# Altium footprint library RPSLib.PcbLib: 116 footprints (part 2 of 8)
Each footprint in its own frame and in the unit in brackets; x right, y up, seen from the top. Pads: shape width x height; smd on the part's side, far side on the other; paste and mask are expansions set on the pad; w line width, h text height; cw(c..) or ccw(c..) is an arc to the next point about the centre after c.
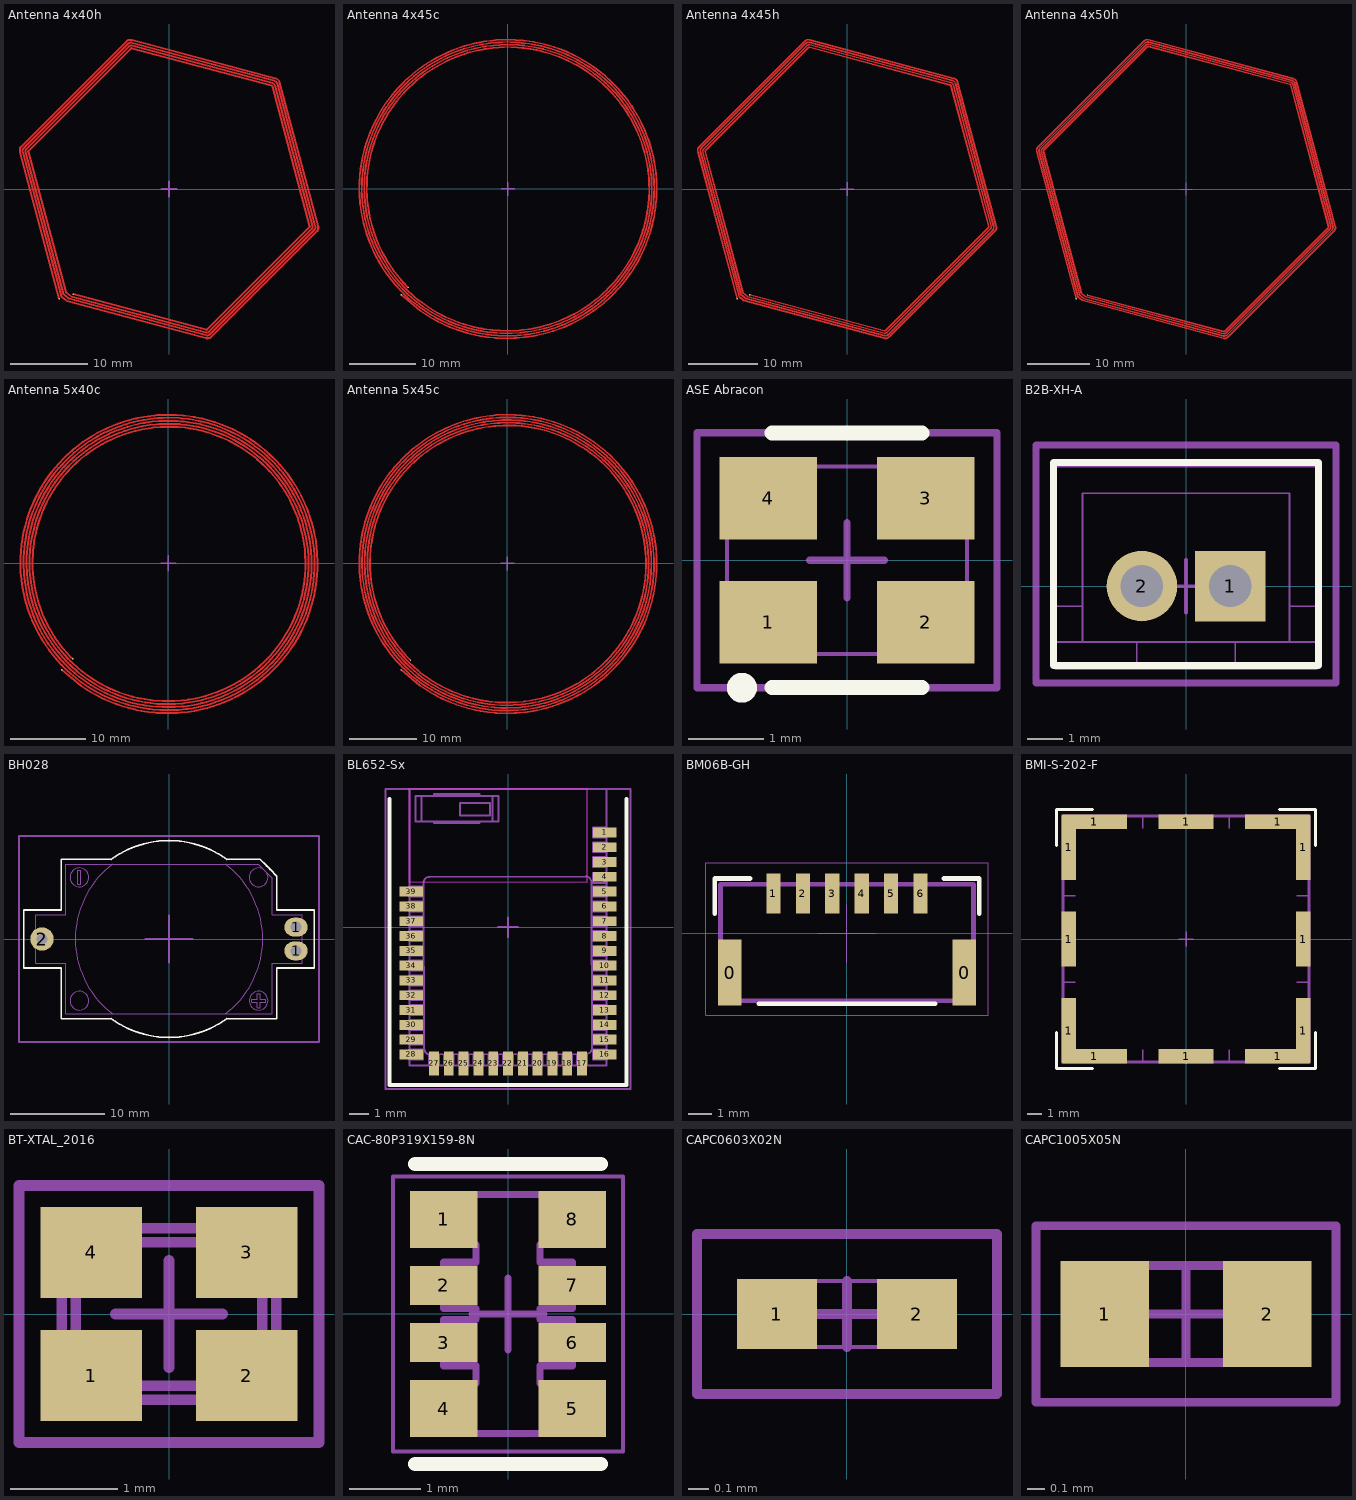
[diagram p1: the footprints below, top view; thin cyan lines are the x and y axes]

## Antenna 4x40h [mm] "Антенна гексагональная 4 витка, 40 мм"
pads (2):
  rect 0.2x0.2 smd mask+0.07: 1(-14.142,-14.142) 2(-12.328,-13.552)
Top Layer:
  region: 325 vertices and 0 holes, not listed, extent -19.326,-19.326 19.326,19.326
Mechanical 15:
  lines w0.2: -1,0 1,0 ; 0,-1 0,1

## Antenna 4x45c [mm] "Антенна спиральная 4 витка, 45 мм"
pads (2):
  rect 0.2x0.2 smd mask+0.07: 1(-15.994,-15.825) 2(-14.933,-14.765)
Top Layer:
  drawing of 1 lines, arcs and shapes, not listed
Mechanical 15:
  lines w0.2: -1,0 1,0 ; 0,-1 0,1

## Antenna 4x45h [mm] "Антенна гексагональная 4 витка, 45 мм"
pads (2):
  rect 0.2x0.2 smd mask+0.07: 1(-15.91,-15.91) 2(-14.095,-15.32)
Top Layer:
  region: 327 vertices and 0 holes, not listed, extent -21.741,-21.741 21.741,21.741
Mechanical 15:
  lines w0.2: -1,0 1,0 ; 0,-1 0,1

## Antenna 4x50h [mm] "Антенна гексагональная 4 витка, 50 мм"
pads (2):
  rect 0.2x0.2 smd mask+0.07: 1(-17.678,-17.678) 2(-15.863,-17.088)
Top Layer:
  region: 319 vertices and 0 holes, not listed, extent -24.156,-24.156 24.156,24.156
Mechanical 15:
  lines w0.2: -1,0 1,0 ; 0,-1 0,1

## Antenna 5x40c [mm] "Антенна спиральная 5 витков, 40 мм"
pads (2):
  rect 0.2x0.2 smd mask+0.07: 1(-14.142,-14.142) 2(-12.728,-12.728)
Top Layer:
  drawing of 1 lines, arcs and shapes, not listed
Mechanical 15:
  lines w0.2: -1,0 1,0 ; 0,-1 0,1

## Antenna 5x45c [mm] "Антенна спиральная 5 витков, 45 мм"
pads (2):
  rect 0.2x0.2 smd mask+0.07: 1(-15.91,-15.91) 2(-14.496,-14.496)
Top Layer:
  drawing of 1 lines, arcs and shapes, not listed
Mechanical 15:
  lines w0.2: -1,0 1,0 ; 0,-1 0,1

## ASE Abracon [mm]
height 1.2
pads (4):
  rect 1.3x1.1 smd mask+0.07: 1(-1.05,-0.825) 2(1.05,-0.825) 3(1.05,0.825) 4(-1.05,0.825)
Top Overlay:
  circle w0.2: c-1.4,-1.7 r0.1
  lines w0.2: -1,-1.7 1,-1.7 ; -1,1.7 1,1.7
Mechanical 13:
  lines w0.05: -1.6,-1.25 1.6,-1.25 1.6,1.25 -1.6,1.25 -1.6,-1.25
Mechanical 15:
  lines w0.1: -0.5,0 0.5,0 ; 0,-0.5 0,0.5 ; -2,-1.7 -2,1.7 2,1.7 2,-1.7 -2,-1.7
3D body "ASE.stp": height 1.2, standoff 0, extent -1.6,-1.25 1.6,1.25

## B2B-XH-A [mm] "2 pin connector"
height 7
pads (2):
  rect 2x2 hole 1.2 mask+0.07: 1(1.25,0)
  round 2 hole 1.2 mask+0.07: 2(-1.25,0)
Top Overlay:
  lines w0.2: -3.75,-2.25 3.75,-2.25 3.75,3.5 -3.75,3.5 -3.75,-2.25
Mechanical 13:
  lines w0.05: -1.753,-2.349 1.753,-2.349 ; -1.753,-1.587 1.753,-1.587 ; -3.696,-1.587 -1.894,-1.587 -1.397,-1.587 -1.397,-2.349 -1.894,-2.349 -3.696,-2.349 -3.696,-1.587 ; -3.696,-1.587 -3.696,-0.572 ; -3.696,-1.587 -2.934,-1.587 -2.934,-0.572 ; -3.696,-0.572 -3.696,3.391 3.696,3.391 3.696,-0.572 ; -3.696,-0.572 -2.934,-0.572 ; -3.696,-0.572 -2.934,-0.572 ; -2.934,-0.572 -2.934,2.629 2.934,2.629 2.934,-0.572 ; 2.934,-0.572 3.696,-0.572 ; 2.934,-0.572 2.934,-1.587 3.696,-1.587 ; 2.934,-0.572 3.696,-0.572 ; 3.696,-1.587 1.894,-1.587 1.397,-1.587 1.397,-2.349 1.894,-2.349 3.696,-2.349 3.696,-1.587 ; 3.696,-1.587 3.696,-0.572
Mechanical 15:
  lines w0.1: -0.75,0 0.75,0 ; 0,-0.75 0,0.75
  lines w0.2: -4.25,-2.75 -4.25,4 4.25,4 4.25,-2.75 -4.25,-2.75
3D body "B2B-XH-A.stp": height 7.11, standoff -3.81, extent -3.696,-2.349 3.696,3.391

## BH028 [mm] "Держатель батареи"
height 5.5
pads (3):
  oval 2.5x2 hole 1.2 mask+0.07: 1(13.55,-1.27) 1(13.55,1.27)
  round 2.5 hole 1.2 mask+0.07: 2(-13.55,0)
Top Overlay:
  lines w0.2: -15.5,-3.1 -15.5,3.1 -11.5,3.1 -11.5,8.5 -6.164,8.5 cw(c0,0) 6.164,8.5 9.707,8.5 10.404,7.803 10.789,7.418 11.5,6.707 11.5,3.1 15.5,3.1 15.5,-3.1 11.5,-3.1 11.5,-8.5 6.164,-8.5 cw(c0,0) -6.164,-8.5 -11.5,-8.5 -11.5,-3.1 -15.5,-3.1
Mechanical 13:
  circle w0.1: c9.562,-6.577 r1
  circle w0.1: c-9.562,-6.577 r1
  circle w0.1: c-9.562,6.577 r1
  lines w0.1: -6,-8 cw(c0,0) -6,8 ; -6,-8 -11,-8 -11,-2.6 -14.2,-2.6 -14.2,2.6 -11,2.6 -11,8 -6,8 ; -6,-8 6,-8 ; -6,8 6,8 ; 6,-8 ccw(c0,0) 6,8 ; 6,-8 11,-8 11,-2.6 14.2,-2.6 14.2,2.6 11,2.6 11,6.5 10.435,7.065 ; 6,8 9.5,8 10.051,7.449 ; 10.051,7.449 ccw(c9.562,6.577) 10.435,7.065 ; 10.051,7.449 10.435,7.065 ; -9.712,5.827 -9.412,5.827 -9.412,7.327 -9.712,7.327 -9.712,5.827 ; 8.812,-6.727 9.412,-6.727 9.412,-7.327 9.712,-7.327 9.712,-6.727 10.312,-6.727 10.312,-6.427 9.712,-6.427 9.712,-5.827 9.412,-5.827 9.412,-6.427 8.812,-6.427 8.812,-6.727
Mechanical 15:
  lines w0.2: -2.5,0 2.5,0 ; 0,-2.5 0,2.5 ; -16,-11 -16,11 16,11 16,-11 -16,-11
3D body "BH028.stp": height 5.5, standoff -2, extent -14.2,-8 14.2,8

## BL652-Sx [mm]
height 2.1
pads (39):
  rect 1.2x0.5 smd mask+0.07: 1(4.9,4.8) 2(4.9,4.046) 3(4.9,3.3) 4(4.9,2.551) 5(4.9,1.801) 6(4.9,1.052) 7(4.9,0.298) 8(4.9,-0.449) 9(4.9,-1.2) 10(4.9,-1.95) 11(4.9,-2.699) 12(4.9,-3.45) 13(4.9,-4.2) 14(4.9,-4.95) 15(4.9,-5.697) 16(4.9,-6.451) 28(-4.9,-6.451) 29(-4.9,-5.697) 30(-4.9,-4.95) 31(-4.9,-4.2) 32(-4.9,-3.45) 33(-4.9,-2.699) 34(-4.9,-1.95) 35(-4.9,-1.2) 36(-4.9,-0.449) 37(-4.9,0.298) 38(-4.9,1.052) 39(-4.9,1.801)
  rect 0.5x1.2 smd mask+0.07: 17(3.75,-6.905) 18(3.002,-6.905) 19(2.252,-6.905) 20(1.502,-6.905) 21(0.751,-6.905) 22(-0.001,-6.905) 23(-0.749,-6.905) 24(-1.5,-6.905) 25(-2.25,-6.905) 26(-3,-6.905) 27(-3.748,-6.905)
Top Overlay:
  lines w0.2: -6,6.5 -6,-8 6,-8 6,6.5
Keep-Out Layer:
  lines w0.1: -5,2.275 4,2.275 4,7 -5,7 -5,2.275
Mechanical 13:
  drawing of 296 lines, arcs and shapes, not listed
Mechanical 15:
  lines w0.1: -0.5,0 0.5,0 ; 0,-0.5 0,0.5 ; -6.2,-8.2 6.2,-8.2 6.2,7 -6.2,7 -6.2,-8.2
3D body "BL652-SA.stp": height 2.35, standoff 0, extent -5.008,-7.006 5.008,7

## BM06B-GH [mm]
height 4.05
pads (8):
  rect 1x2.8 smd paste-0.05: 0(-4.975,-1.675) 0(4.975,-1.675)
  rect 0.6x1.7 smd paste-0.05: 1(-3.125,1.675) 2(-1.875,1.675) 3(-0.625,1.675) 4(0.625,1.675) 5(1.875,1.675) 6(3.125,1.675)
Top Overlay:
  lines w0.2: -5.625,0.825 -5.625,2.325 -4.125,2.325 ; -3.75,-3 3.75,-3 ; 4.125,2.325 5.625,2.325 5.625,0.825
Mechanical 13:
  lines w0.2: -5.375,-2.875 5.375,-2.875 5.375,2.075 -5.375,2.075 -5.375,-2.875
Mechanical 15:
  lines w0.05: -1.25,0 1.25,0 ; 0,-1.25 0,1.25 ; -6,-3.5 -6,3 6,3 6,-3.5 -6,-3.5
3D body "BM06B-GHS-TBT.STEP": height 4.18, standoff -0.03, extent -5.375,-2.875 5.375,2.075

## BMI-S-202-F [mm] "EMI Shield"
height 3.6
pads (12):
  rect 1x4.55 smd paste-0.07 mask+0.07: 1(-8.15,-6.375) 1(-8.15,6.375) 1(8.15,-6.375) 1(8.15,6.375)
  rect 1x3.8 smd paste-0.07 mask+0.07: 1(-8.15,0) 1(8.15,0)
  rect 4.55x1 smd paste-0.07 mask+0.07: 1(-6.375,-8.15) 1(-6.375,8.15) 1(6.375,-8.15) 1(6.375,8.15)
  rect 3.8x1 smd paste-0.07 mask+0.07: 1(0,-8.15) 1(0,8.15)
Top Overlay:
  lines w0.2: -9,-6.5 -9,-9 -6.5,-9 ; -9,6.5 -9,9 -6.5,9 ; 6.5,-9 9,-9 9,-6.5 ; 6.5,9 9,9 9,6.5
Mechanical 13:
  lines w0.1: -8.549,-3 -7.7,-3 ; -8.549,3 -7.7,3 ; -3,-8.549 -3,-7.7 ; -3,7.7 -3,8.55 ; 3,-8.549 3,-7.7 ; 3,7.7 3,8.55 ; 7.7,-3 8.55,-3 ; 7.7,3 8.55,3
  lines w0.2: -8.549,-8.549 -8.549,8.55 8.55,8.55 8.55,-8.549 -8.549,-8.549
Mechanical 15:
  lines w0.1: -0.5,0 0.5,0 ; 0,-0.5 0,0.5
3D body "Laird-BMI-S-202-F.stp": height 3.6, standoff 0, extent -8.549,-8.549 8.55,8.55

## BT-XTAL_2016 [mm] "Crystal 2.0 x 1.6 mm"
height 0.5
pads (4):
  rect 0.95x0.85 smd: 1(-0.725,-0.575) 2(0.725,-0.575) 3(0.725,0.575) 4(-0.725,0.575)
Mechanical 13:
  lines w0.1: -1,-0.7 cw(c-1,-0.8) -0.9,-0.8 0.9,-0.8 cw(c1,-0.8) 1,-0.7 1,0.7 cw(c1,0.8) 0.9,0.8 -0.9,0.8 cw(c-1,0.8) -1,0.7 -1,-0.7 ; -0.87,-0.57 ccw(c-0.77,-0.57) -0.77,-0.67 0.77,-0.67 ccw(c0.77,-0.57) 0.87,-0.57 0.87,0.57 ccw(c0.77,0.57) 0.77,0.67 -0.77,0.67 ccw(c-0.77,0.57) -0.87,0.57 -0.87,-0.57
Mechanical 15:
  lines w0.1: -0.5,0 0.5,0 ; 0,-0.5 0,0.5 ; -1.4,-1.2 1.4,-1.2 1.4,1.2 -1.4,1.2 -1.4,-1.2
3D body: height 0.56, standoff 0.15, extent -0.7,-0.65 0.7,0.65
3D body "User Library-GeyerElectronics_KX5.step": height 0.56, standoff 0, extent -1.05,-0.85 1.05,0.85

## CAC-80P319X159-8N [mm] "Chip Array, ConvexS, 8-Leads, Pitch 0.80mm,  Body 3.20x1.60mm,  IPC Medium Density"
height 1
pads (8):
  rect 0.95x0.8 smd mask+0.07: 1(-0.9,1.325) 4(-0.9,-1.325) 5(0.9,-1.325) 8(0.9,1.325)
  rect 0.95x0.55 smd mask+0.07: 2(-0.9,0.4) 3(-0.9,-0.4) 6(0.9,-0.4) 7(0.9,0.4)
Top Overlay:
  lines w0.2: -1.3,-2.1 1.3,-2.1 ; -1.3,2.1 1.3,2.1
Mechanical 13:
  lines w0.1: -0.9,-1.675 0.9,-1.675 0.9,-0.975 0.45,-0.975 0.45,-0.725 0.9,-0.725 0.9,-0.075 0.45,-0.075 0.45,0.075 0.9,0.075 0.9,0.725 0.45,0.725 0.45,0.975 0.9,0.975 0.9,1.675 -0.9,1.675 -0.9,0.975 -0.45,0.975 -0.45,0.725 -0.9,0.725 -0.9,0.075 -0.45,0.075 -0.45,-0.075 -0.9,-0.075 -0.9,-0.725 -0.45,-0.725 -0.45,-0.975 -0.9,-0.975 -0.9,-1.675
Mechanical 15:
  lines w0.05: -1.61,-1.925 1.61,-1.925 1.61,1.925 -1.61,1.925 -1.61,-1.925
  lines w0.1: -0.5,0 0.5,0 ; 0,-0.5 0,0.5
3D body "CAC-80P319X159-8N.step": height 1, standoff 0, extent -0.95,-1.675 0.95,1.675

## CAPC0603X02N [mm] "Chip Capacitor, 2-Leads, Body 0.60x0.30mm, IPC Medium Density"
height 0.23
pads (2):
  rect 0.4x0.35 smd paste-1: 1(-0.35,0) 2(0.35,0)
Top Paste:
  region: 0.45,0.15 0.46,0.15 0.478,0.142 0.492,0.128 0.5,0.11 0.5,0.1 0.5,-0.1 0.5,-0.11 0.492,-0.128 0.478,-0.142 0.46,-0.15 0.45,-0.15 0.225,-0.15 0.215,-0.15 0.197,-0.142 0.183,-0.128 0.175,-0.11 0.175,-0.1 0.175,0.1 0.175,0.11 0.183,0.128 0.197,0.142 0.215,0.15 0.225,0.15
  region: -0.45,-0.15 -0.46,-0.15 -0.478,-0.142 -0.492,-0.128 -0.5,-0.11 -0.5,-0.1 -0.5,0.1 -0.5,0.11 -0.492,0.128 -0.478,0.142 -0.46,0.15 -0.45,0.15 -0.225,0.15 -0.215,0.15 -0.197,0.142 -0.183,0.128 -0.175,0.11 -0.175,0.1 -0.175,-0.1 -0.175,-0.11 -0.183,-0.128 -0.197,-0.142 -0.215,-0.15 -0.225,-0.15
Mechanical 13:
  lines w0.02: -0.315,-0.165 -0.315,0.165 0.315,0.165 0.315,-0.165 -0.315,-0.165
Mechanical 15:
  lines w0.05: -0.165,0 0.165,0 ; 0,-0.165 0,0.165 ; -0.75,-0.4 -0.75,0.4 0.75,0.4 0.75,-0.4 -0.75,-0.4
3D body "CAPC0603X02N.step": height 0.23, standoff 0, extent -0.315,-0.165 0.315,0.165

## CAPC1005X05N [mm] "Chip Capacitor, 2-Leads, Body 1.00x0.50mm, IPC Medium Density"
height 0.45
pads (2):
  rect 0.5x0.6 smd paste-0.03 mask+0.07: 1(-0.46,0) 2(0.46,0)
Mechanical 13:
  lines w0.05: -0.525,-0.275 -0.525,0.275 0.525,0.275 0.525,-0.275 -0.525,-0.275
Mechanical 15:
  lines w0.05: -0.275,0 0.275,0 ; 0,-0.275 0,0.275 ; -0.85,-0.5 0.85,-0.5 0.85,0.5 -0.85,0.5 -0.85,-0.5
3D body "CAPC1005X05N.step": height 0.45, standoff 0, extent -0.525,-0.275 0.525,0.275